# Altium integrated library RL2.IntLib: 663 symbols (part 4 of 4)
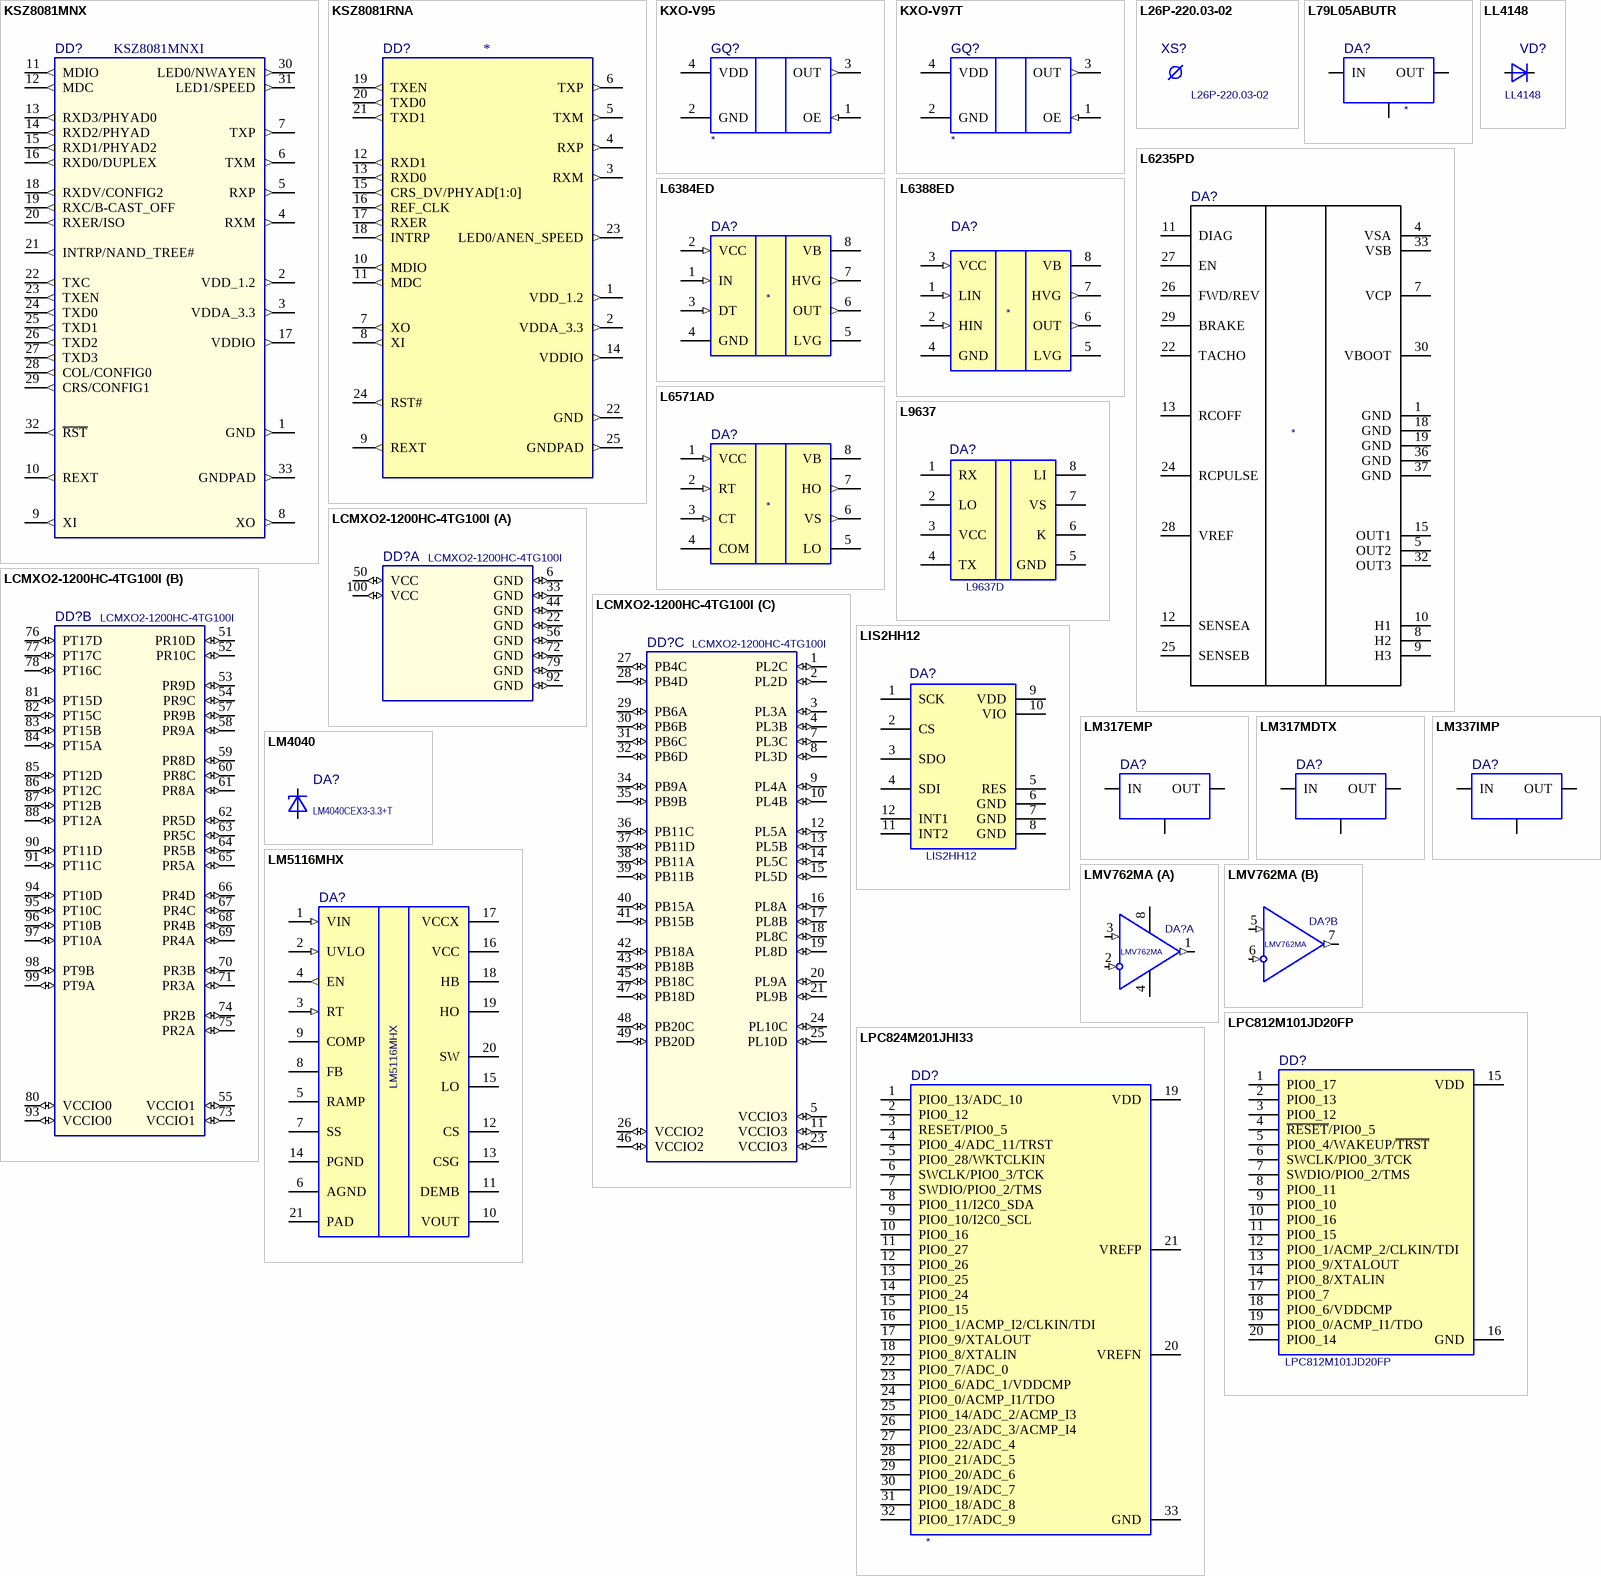
[diagram p37: symbols KSZ8081MNX to LPC824M201JHI33]

## L9637
designator DA?, comment L9637D
Monolithic bus driver with ISO 9141 interface; Part Field 1: *; Part Field 2: *
footprint SOIC8 JEDEC
pins: 1 RX, 2 LO, 3 VCC, 4 TX, 5 GND, 6 K, 7 VS, 8 LI

## LCMXO2-1200HC-4TG100I
designator DD?
footprint LQFP100_MS-026
part A pins: 6 GND (io), 22 GND (io), 33 GND (io), 44 GND (io), 50 VCC (io), 56 GND (io), 72 GND (io), 79 GND (io), 92 GND (io), 100 VCC (io)
part B pins: 51 PR10D (io), 52 PR10C (io), 53 PR9D (io), 54 PR9C (io), 55 VCCIO1 (io), 57 PR9B (io), 58 PR9A (io), 59 PR8D (io), 60 PR8C (io), 61 PR8A (io), 62 PR5D (io), 63 PR5C (io), 64 PR5B (io), 65 PR5A (io), 66 PR4D (io), 67 PR4C (io), 68 PR4B (io), 69 PR4A (io), 70 PR3B (io), 71 PR3A (io), 73 VCCIO1 (io), 74 PR2B (io), 75 PR2A (io), 76 PT17D (io), 77 PT17C (io), 78 PT16C (io), 80 VCCIO0 (io), 81 PT15D (io), 82 PT15C (io), 83 PT15B (io), 84 PT15A (io), 85 PT12D (io), 86 PT12C (io), 87 PT12B (io), 88 PT12A (io), 90 PT11D (io), 91 PT11C (io), 93 VCCIO0 (io), 94 PT10D (io), 95 PT10C (io), 96 PT10B (io), 97 PT10A (io), 98 PT9B (io), 99 PT9A (io)
part C pins: 1 PL2C (io), 2 PL2D (io), 3 PL3A (io), 4 PL3B (io), 5 VCCIO3 (io), 7 PL3C (io), 8 PL3D (io), 9 PL4A (io), 10 PL4B (io), 11 VCCIO3 (io), 12 PL5A (io), 13 PL5B (io), 14 PL5C (io), 15 PL5D (io), 16 PL8A (io), 17 PL8B (io), 18 PL8C (io), 19 PL8D (io), 20 PL9A (io), 21 PL9B (io), 23 VCCIO3 (io), 24 PL10C (io), 25 PL10D (io), 26 VCCIO2 (io), 27 PB4C (io), 28 PB4D (io), 29 PB6A (io), 30 PB6B (io), 31 PB6C (io), 32 PB6D (io), 34 PB9A (io), 35 PB9B (io), 36 PB11C (io), 37 PB11D (io), 38 PB11A (io), 39 PB11B (io), 40 PB15A (io), 41 PB15B (io), 42 PB18A (io), 43 PB18B (io), 45 PB18C (io), 46 VCCIO2 (io), 47 PB18D (io), 48 PB20C (io), 49 PB20D (io)

## LIS2HH12
designator DA?
ultra-low-power high-performance 3-axis "pico" accelerometer; Part Field 1: *; Part Field 2: *
footprint LGA-12
pins: 1 SCK, 2 CS, 3 SDO, 4 SDI, 5 RES, 6 GND, 7 GND, 8 GND, 9 VDD, 10 VIO, 11 INT2, 12 INT1

## LL4148
designator VD?
Value: *
footprint SOD-80 (DO-213AC)
pins: 1, 2

## LM317EMP
designator DA?, comment LM317EMP/NOPB  (value not drawn)
LM317EMP; Value: *
footprint SOT-223 PWR
pins: 1 G, 2 OUT, 3 IN

## LM317MDTX
designator DA?  (value not drawn)
LM317MDTX; Value: *
footprint D-PAK (TO-252)
pins: 1 G, 2 IN, 3 OUT

## LM337IMP
designator DA?, comment LM337IMP/NOPB  (value not drawn)
Value: *
footprint SOT-223 PWR
pins: 1 G, 2 IN, 3 OUT

## LM4040
designator DA?, comment LM4040CEX3-3.3+T
Improved Precision Micropower Shunt Voltage Reference
footprint SOT-23
pins: 1, 2

## LM5116MHX
designator DA?
6-100V Wide Vin, Current Mode Synchronous Buck Controller
footprint HTSSOP20 (MXA20A)
pins: 1 VIN (in), 2 UVLO (in), 3 RT (in), 4 EN (out), 5 RAMP (power), 6 AGND (power), 7 SS (power), 8 FB (power), 9 COMP (power), 10 VOUT (power), 11 DEMB (power), 12 CS (power), 13 CSG (power), 14 PGND (power), 15 LO (power), 16 VCC (power), 17 VCCX (power), 18 HB (power), 19 HO (power), 20 SW (power), 21 PAD (power)

## LMV762MA
designator DA?
footprint SOIC8 JEDEC
part A pins: 1 OUT (out), 2 - (in), 3 + (in), 4 V- (power), 8 V+ (power)
part B pins: 5 + (in), 6 - (in), 7 OUT (out)

## LPC812M101JD20FP
designator DD?
footprint SO20
footprint TSSOP20 (JEDEC MO-153)
footprint SO20 (JEDEC MS-013)
pins: 1 PIO0_17, 2 PIO0_13, 3 PIO0_12, 4 ~{RESET}/PIO0_5, 5 PIO0_4/WAKEUP/~{TRST}, 6 SWCLK/PIO0_3/TCK, 7 SWDIO/PIO0_2/TMS, 8 PIO0_11, 9 PIO0_10, 10 PIO0_16, 11 PIO0_15, 12 PIO0_1/ACMP_2/CLKIN/TDI, 13 PIO0_9/XTALOUT, 14 PIO0_8/XTALIN, 15 VDD, 16 GND, 17 PIO0_7, 18 PIO0_6/VDDCMP, 19 PIO0_0/ACMP_I1/TDO, 20 PIO0_14

## LPC824M201JHI33
designator DD?
footprint HVQFN33
pins: 1 PIO0_13/ADC_10, 2 PIO0_12, 3 RESET/PIO0_5, 4 PIO0_4/ADC_11/TRST, 5 PIO0_28/WKTCLKIN, 6 SWCLK/PIO0_3/TCK , 7 SWDIO/PIO0_2/TMS, 8 PIO0_11/I2C0_SDA, 9 PIO0_10/I2C0_SCL, 10 PIO0_16, 11 PIO0_27, 12 PIO0_26, 13 PIO0_25, 14 PIO0_24, 15 PIO0_15, 16 PIO0_1/ACMP_I2/CLKIN/TDI, 17 PIO0_9/XTALOUT, 18 PIO0_8/XTALIN, 19 VDD, 20 VREFN, 21 VREFP, 22 PIO0_7/ADC_0, 23 PIO0_6/ADC_1/VDDCMP, 24 PIO0_0/ACMP_I1/TDO, 25 PIO0_14/ADC_2/ACMP_I3, 26 PIO0_23/ADC_3/ACMP_I4, 27 PIO0_22/ADC_4, 28 PIO0_21/ADC_5, 29 PIO0_20/ADC_6, 30 PIO0_19/ADC_7, 31 PIO0_18/ADC_8, 32 PIO0_17/ADC_9, 33 GND

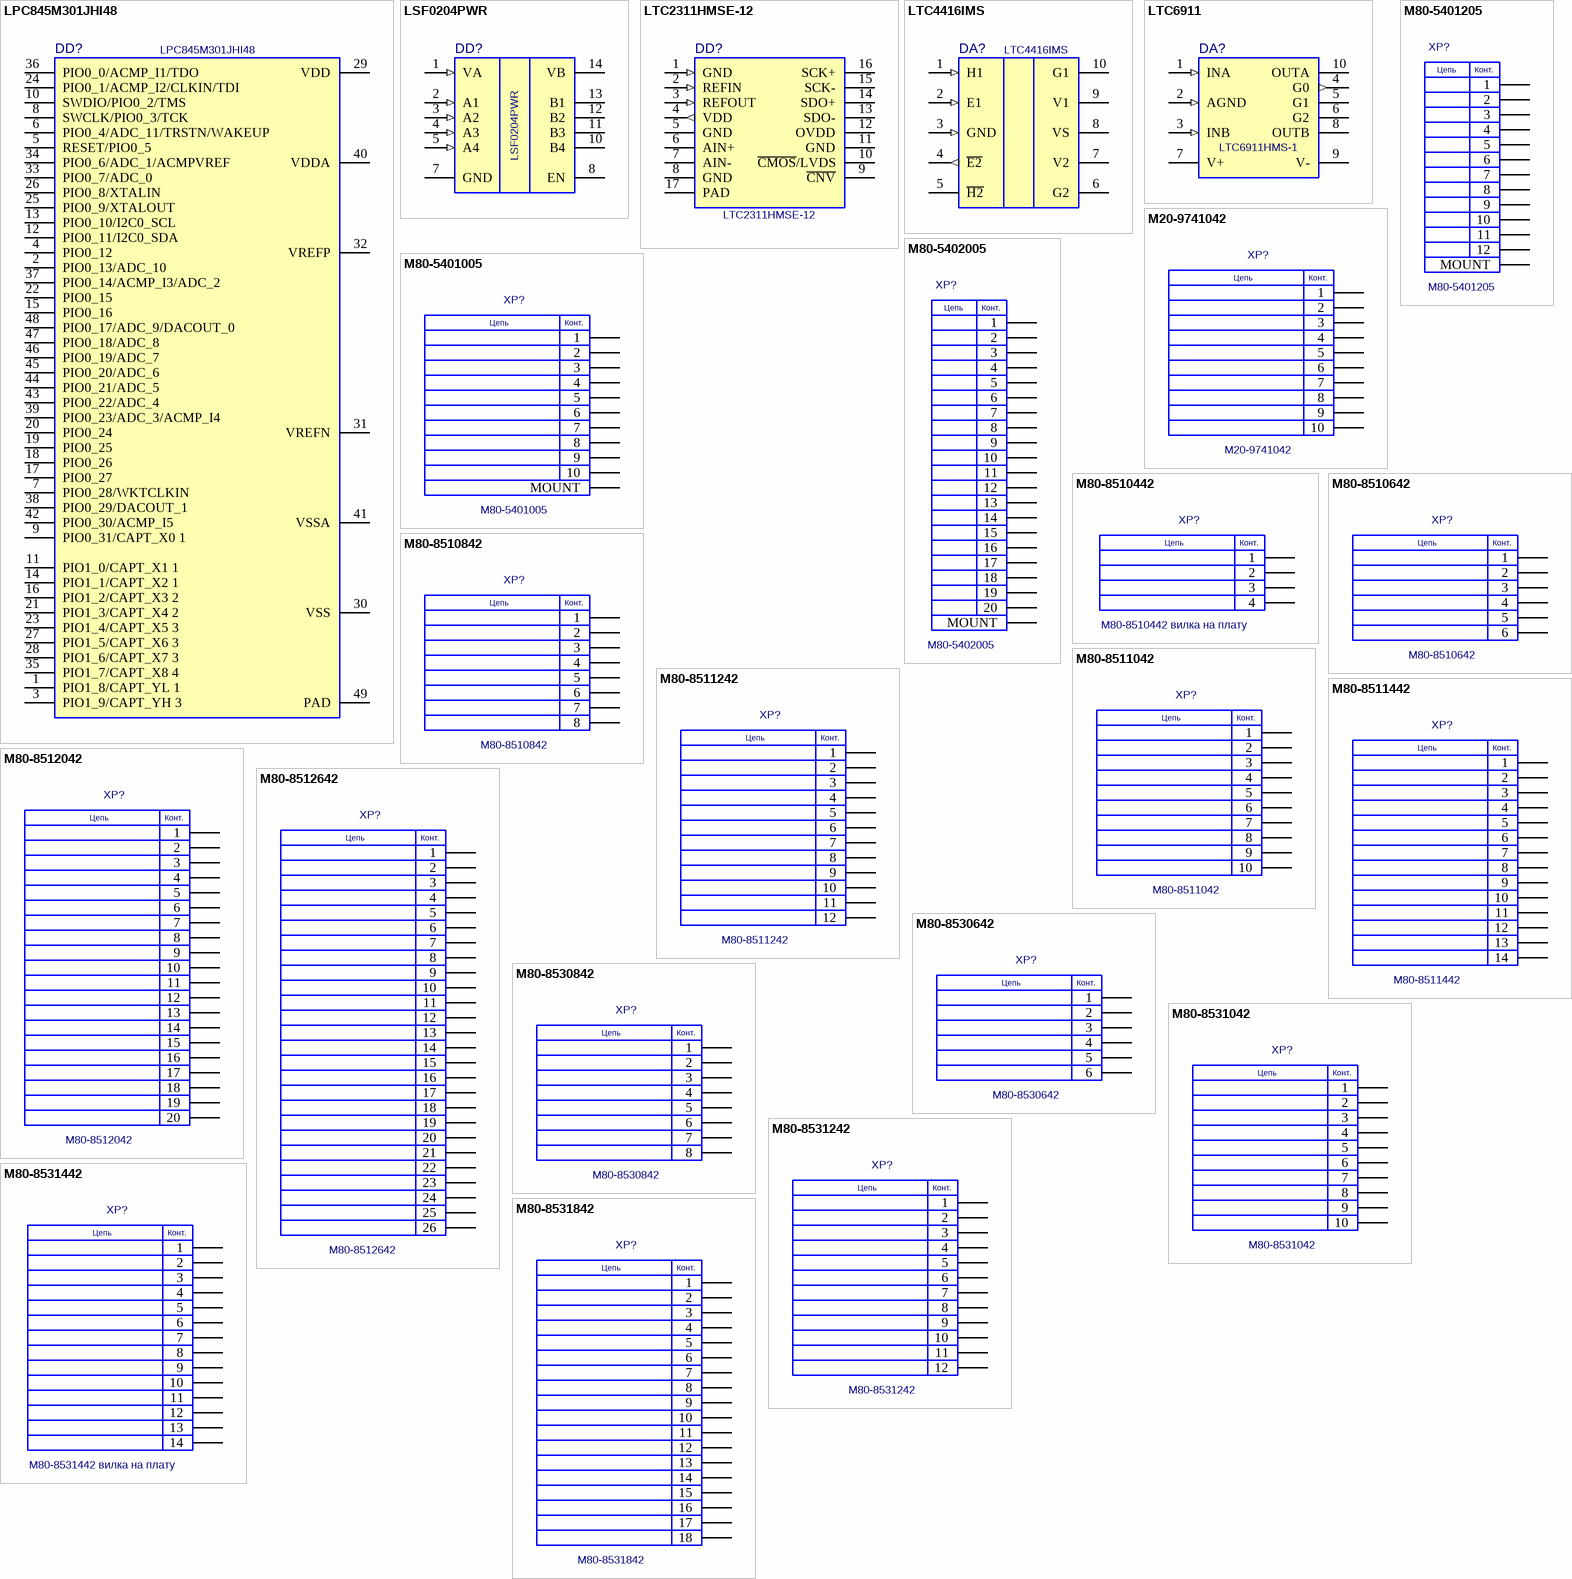
[diagram p29: symbols LPC845M301JHI48 to M80-8531842]

## LPC845M301JHI48
designator DD?
footprint HVQFN48 (SOT619-1, plastic thermal enhanced very thin quad flat package; no leads;  48 terminals; body 7 x 7 x 0.85 mm)
pins: 1 PIO1_8/CAPT_YL 1, 2 PIO0_13/ADC_10, 3 PIO1_9/CAPT_YH 3, 4 PIO0_12, 5 RESET/PIO0_5, 6 PIO0_4/ADC_11/TRSTN/WAKEUP, 7 PIO0_28/WKTCLKIN, 8 SWCLK/PIO0_3/TCK, 9 PIO0_31/CAPT_X0 1, 10 SWDIO/PIO0_2/TMS, 11 PIO1_0/CAPT_X1 1, 12 PIO0_11/I2C0_SDA, 13 PIO0_10/I2C0_SCL, 14 PIO1_1/CAPT_X2 1, 15 PIO0_16, 16 PIO1_2/CAPT_X3 2, 17 PIO0_27, 18 PIO0_26, 19 PIO0_25, 20 PIO0_24, 21 PIO1_3/CAPT_X4 2, 22 PIO0_15, 23 PIO1_4/CAPT_X5 3, 24 PIO0_1/ACMP_I2/CLKIN/TDI, 25 PIO0_9/XTALOUT, 26 PIO0_8/XTALIN, 27 PIO1_5/CAPT_X6 3, 28 PIO1_6/CAPT_X7 3, 29 VDD, 30 VSS, 31 VREFN, 32 VREFP, 33 PIO0_7/ADC_0, 34 PIO0_6/ADC_1/ACMPVREF, 35 PIO1_7/CAPT_X8 4, 36 PIO0_0/ACMP_I1/TDO, 37 PIO0_14/ACMP_I3/ADC_2, 38 PIO0_29/DACOUT_1, 39 PIO0_23/ADC_3/ACMP_I4, 40 VDDA, 41 VSSA, 42 PIO0_30/ACMP_I5, 43 PIO0_22/ADC_4, 44 PIO0_21/ADC_5, 45 PIO0_20/ADC_6, 46 PIO0_19/ADC_7, 47 PIO0_18/ADC_8, 48 PIO0_17/ADC_9/DACOUT_0, 49 PAD

## LSF0204PWR
designator DD?
footprint TSSOP14 (JEDEC MO-153)
pins: 1 VA (in), 2 A1 (in), 3 A2 (in), 4 A3 (in), 5 A4 (in), 7 GND (power), 8 EN (power), 10 B4 (power), 11 B3 (power), 12 B2 (power), 13 B1 (power), 14 VB (power)

## LTC2311HMSE-12
designator DD?
12-Bit + Sign, 5Msps / Differential Input ADC with Wide / Input Common Mode Range
footprint MSOP16 POWERPAD (MSE Package (Reference LTC DWG # 05-08-1667 Rev F))
pins: 1 GND (in), 2 REFIN (in), 3 REFOUT (in), 4 VDD (out), 5 GND (power), 6 AIN+ (power), 7 AIN- (power), 8 GND (power), 9 ~{CNV} (power), 10 ~{CMOS}/LVDS (power), 11 GND (power), 12 OVDD (power), 13 SDO- (power), 14 SDO+ (power), 15 SCK- (power), 16 SCK+ (power), 17 PAD (power)

## LTC4416IMS
designator DA?
36V, Low Loss Dual PowerPath Controllers for Large PFETs
footprint MSOP10 (MO-187-BA)
pins: 1 H1 (in), 2 E1 (in), 3 GND (in), 4 ~{E2} (out), 5 ~{H2} (power), 6 G2 (power), 7 V2 (power), 8 VS (power), 9 V1 (power), 10 G1 (power)

## LTC6911
designator DA?, comment LTC6911HMS-1
Dual Matched Amplifiers with Digitally Programmable Gain in MSOP
footprint MSOP10 (MO-187-BA)
pins: 1 INA (in), 2 AGND (in), 3 INB (in), 4 G0 (out), 5 G1 (power), 6 G2 (power), 7 V+ (power), 8 OUTB (power), 9 V- (power), 10 OUTA (power)

## M20-9741042
designator XP?
Value: *
footprint M20-9741042
pins: 1, 2, 3, 4, 5, 6, 7, 8, 9, 10
text: Цепь; Конт.

## M80-5401005
designator XP?
M80-8531242; Value: *
footprint M80-5401005
pins: 0 MOUNT, 1, 2, 3, 4, 5, 6, 7, 8, 9, 10
text: Цепь; Конт.

## M80-5401205
designator XP?
Value: *
footprint M80-5401205
pins: 0 MOUNT, 1, 2, 3, 4, 5, 6, 7, 8, 9, 10, 11, 12
text: Цепь; Конт.

## M80-5402005
designator XP?
M80-5401205; Value: *
footprint M80-5402005
pins: 0 MOUNT, 1, 2, 3, 4, 5, 6, 7, 8, 9, 10, 11, 12, 13, 14, 15, 16, 17, 18, 19, 20
text: Цепь; Конт.

## M80-8510442
designator XP?, comment M80-8510442 вилка на плату
M80-8510642; Value: *
footprint M80-85104
pins: 1, 2, 3, 4
text: Цепь; Конт.

## M80-8510642
designator XP?
Value: *
footprint M80-85106
pins: 1, 2, 3, 4, 5, 6
text: Цепь; Конт.

## M80-8510842
designator XP?
Value: *
footprint M80-85108
pins: 1, 2, 3, 4, 5, 6, 7, 8
text: Цепь; Конт.

## M80-8511042
designator XP?
Value: *
footprint M80-85110
pins: 1, 2, 3, 4, 5, 6, 7, 8, 9, 10
text: Цепь; Конт.

## M80-8511242
designator XP?
Value: *
footprint M80-85112
pins: 1, 2, 3, 4, 5, 6, 7, 8, 9, 10, 11, 12
text: Цепь; Конт.

## M80-8511442
designator XP?
Value: *
footprint M80-85114
pins: 1, 2, 3, 4, 5, 6, 7, 8, 9, 10, 11, 12, 13, 14
text: Цепь; Конт.

## M80-8512042
designator XP?
Value: *
footprint M80-85120
pins: 1, 2, 3, 4, 5, 6, 7, 8, 9, 10, 11, 12, 13, 14, 15, 16, 17, 18, 19, 20
text: Цепь; Конт.

## M80-8512642
designator XP?
M80-8532042; Value: *
footprint M80-85126
pins: 1, 2, 3, 4, 5, 6, 7, 8, 9, 10, 11, 12, 13, 14, 15, 16, 17, 18, 19, 20, 21, 22, 23, 24, 25, 26
text: Цепь; Конт.

## M80-8530642
designator XP?
Value: *
footprint M80-85306
pins: 1, 2, 3, 4, 5, 6
text: Цепь; Конт.

## M80-8530842
designator XP?
Value: *
footprint M80-85308
pins: 1, 2, 3, 4, 5, 6, 7, 8
text: Цепь; Конт.

## M80-8531042
designator XP?
Value: *
footprint M80-85310
pins: 1, 2, 3, 4, 5, 6, 7, 8, 9, 10
text: Цепь; Конт.

## M80-8531242
designator XP?
Value: *
footprint M80-85312
pins: 1, 2, 3, 4, 5, 6, 7, 8, 9, 10, 11, 12
text: Цепь; Конт.

## M80-8531442
designator XP?, comment M80-8531442 вилка на плату
M80-8531442; Value: *
footprint M80-85314
pins: 1, 2, 3, 4, 5, 6, 7, 8, 9, 10, 11, 12, 13, 14
text: Цепь; Конт.

## M80-8531842
designator XP?
Value: *
footprint M80-85318
pins: 1, 2, 3, 4, 5, 6, 7, 8, 9, 10, 11, 12, 13, 14, 15, 16, 17, 18
text: Цепь; Конт.

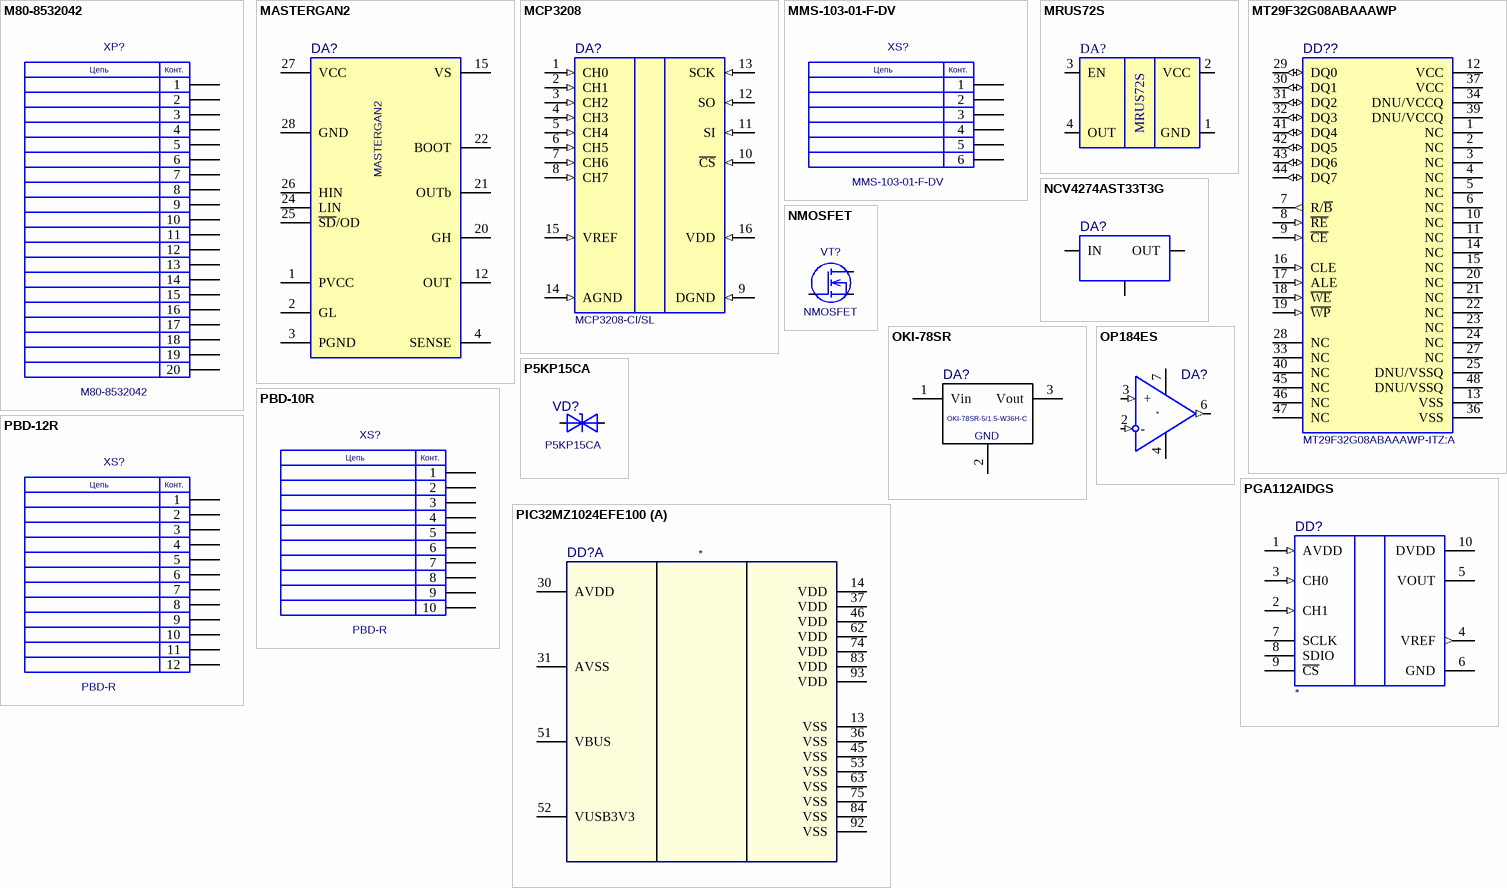
[diagram p30: symbols M80-8532042 to PIC32MZ1024EFE100]

## M80-8532042
designator XP?
Value: *
footprint M80-85320
pins: 1, 2, 3, 4, 5, 6, 7, 8, 9, 10, 11, 12, 13, 14, 15, 16, 17, 18, 19, 20
text: Цепь; Конт.

## MASTERGAN2
designator DA?
High power density 600V Half bridge driver with two enhancement mode GaN HEMT / RDS(ON) = 150 mΩ (LS) + 225 mΩ (HS) / IDS(MAX) = 10 A (LS) + 6.5 A (HS); Part Field 1: *; Part Field 2: *
footprint MASTERGAN2 (QFN 9 x 9 x 1 mm)
pins: 1 PVCC, 2 GL, 3 PGND, 4 SENSE, 12 OUT, 15 VS, 20 GH, 21 OUTb, 22 BOOT, 24 LIN, 25 ~{SD}/OD, 26 HIN, 27 VCC, 28 GND

## MCP3208
designator DA?, comment MCP3208-CI/SL
8-Channel 12-Bit A/D Converter with SPI™   Serial Interface
footprint SOIC16
signal-integrity model Model Name (Model Description)
pins: 1 CH0 (in), 2 CH1 (in), 3 CH2 (in), 4 CH3 (in), 5 CH4 (in), 6 CH5 (in), 7 CH6 (in), 8 CH7 (in), 9 DGND (in), 10 ~{CS} (in), 11 SI (in), 12 SO (in), 13 SCK (in), 14 AGND (in), 15 VREF (in), 16 VDD (in)

## MMS-103-01-F-DV
designator XS?
Value: *
footprint MMS-103-01-F-DV
pins: 1, 2, 3, 4, 5, 6
text: Цепь; Конт.

## MRUS72S
designator DA?
Hall sensor
footprint MINI FLP-4
pins: 1 GND, 2 VCC, 3 EN, 4 OUT

## MT29F32G08ABAAAWP
designator DD??, comment MT29F32G08ABAAAWP-ITZ:A
Part Field 1: *; Part Field 2: *
footprint TSSO12X20-G48/P.5
pins: 1 NC, 2 NC, 3 NC, 4 NC, 5 NC, 6 NC, 7 R/~{B} (out), 8 ~{RE} (in), 9 ~{CE} (in), 10 NC, 11 NC, 12 VCC (power), 13 VSS (power), 14 NC (power), 15 NC (power), 16 CLE (in), 17 ALE (in), 18 ~{WE} (in), 19 ~{WP} (in), 20 NC, 21 NC, 22 NC, 23 NC, 24 NC, 25 DNU/VSSQ, 27 NC, 28 NC, 29 DQ0 (io), 30 DQ1 (io), 31 DQ2 (io), 32 DQ3 (io), 33 NC, 34 DNU/VCCQ, 36 VSS (power), 37 VCC (power), 39 DNU/VCCQ, 40 NC, 41 DQ4 (io), 42 DQ5 (io), 43 DQ6 (io), 44 DQ7 (io), 45 NC, 46 NC, 47 NC, 48 DNU/VSSQ

## NCV4274AST33T3G
designator DA?  (value not drawn)
NCV4274AST33T3G; Value: *
footprint SOT-223 PWR
pins: 1 IN, 2 G, 3 OUT

## NMOSFET
designator VT?
N-channel MOSFET; OriginalName: 2N4124; ComponentField6: Published 8-Jun-2000, Modified 11-July-2000: SIM Model Added.; Value: *
footprint D-PAK (TO-252)
footprint D2PAK TO-263-2
footprint D3PAK TO-268-2L
pins: 1 G, 2 S, 3 D

## OKI-78SR
designator DA?, comment OKI-78SR-5/1.5-W36H-C
Fixed Output 1.5 Amp SIP DC/DC Converter
footprint OKI-78SR-H
pins: 1 Vin, 2, 3 Vout
text: GND

## OP184ES
designator DA?
footprint SOIC8 JEDEC
pins: 2 - (in), 3 + (in), 4 V- (power), 6 OUT (out), 7 V+ (power)

## P5KP15CA
designator VD?
footprint P600
pins: 1, 2

## PBD-10R
designator XS?, comment PBD-R
Value: *; Part Field 2: 10 конт.
footprint PBD-10R
pins: 1, 2, 3, 4, 5, 6, 7, 8, 9, 10
text: Цепь; Конт.

## PBD-12R
designator XS?, comment PBD-R
Value: *; Part Field 2: 12 конт.
footprint PBD-12R
pins: 1, 2, 3, 4, 5, 6, 7, 8, 9, 10, 11, 12
text: Цепь; Конт.

## PGA112AIDGS
designator DD?
footprint MSOP10 (MO-187-BA)
pins: 1 AVDD (in), 2 CH1 (in), 3 CH0 (in), 4 VREF (out), 5 VOUT (power), 6 GND (power), 7 SCLK (power), 8 SDIO (power), 9 ~{CS} (power), 10 DVDD (power)

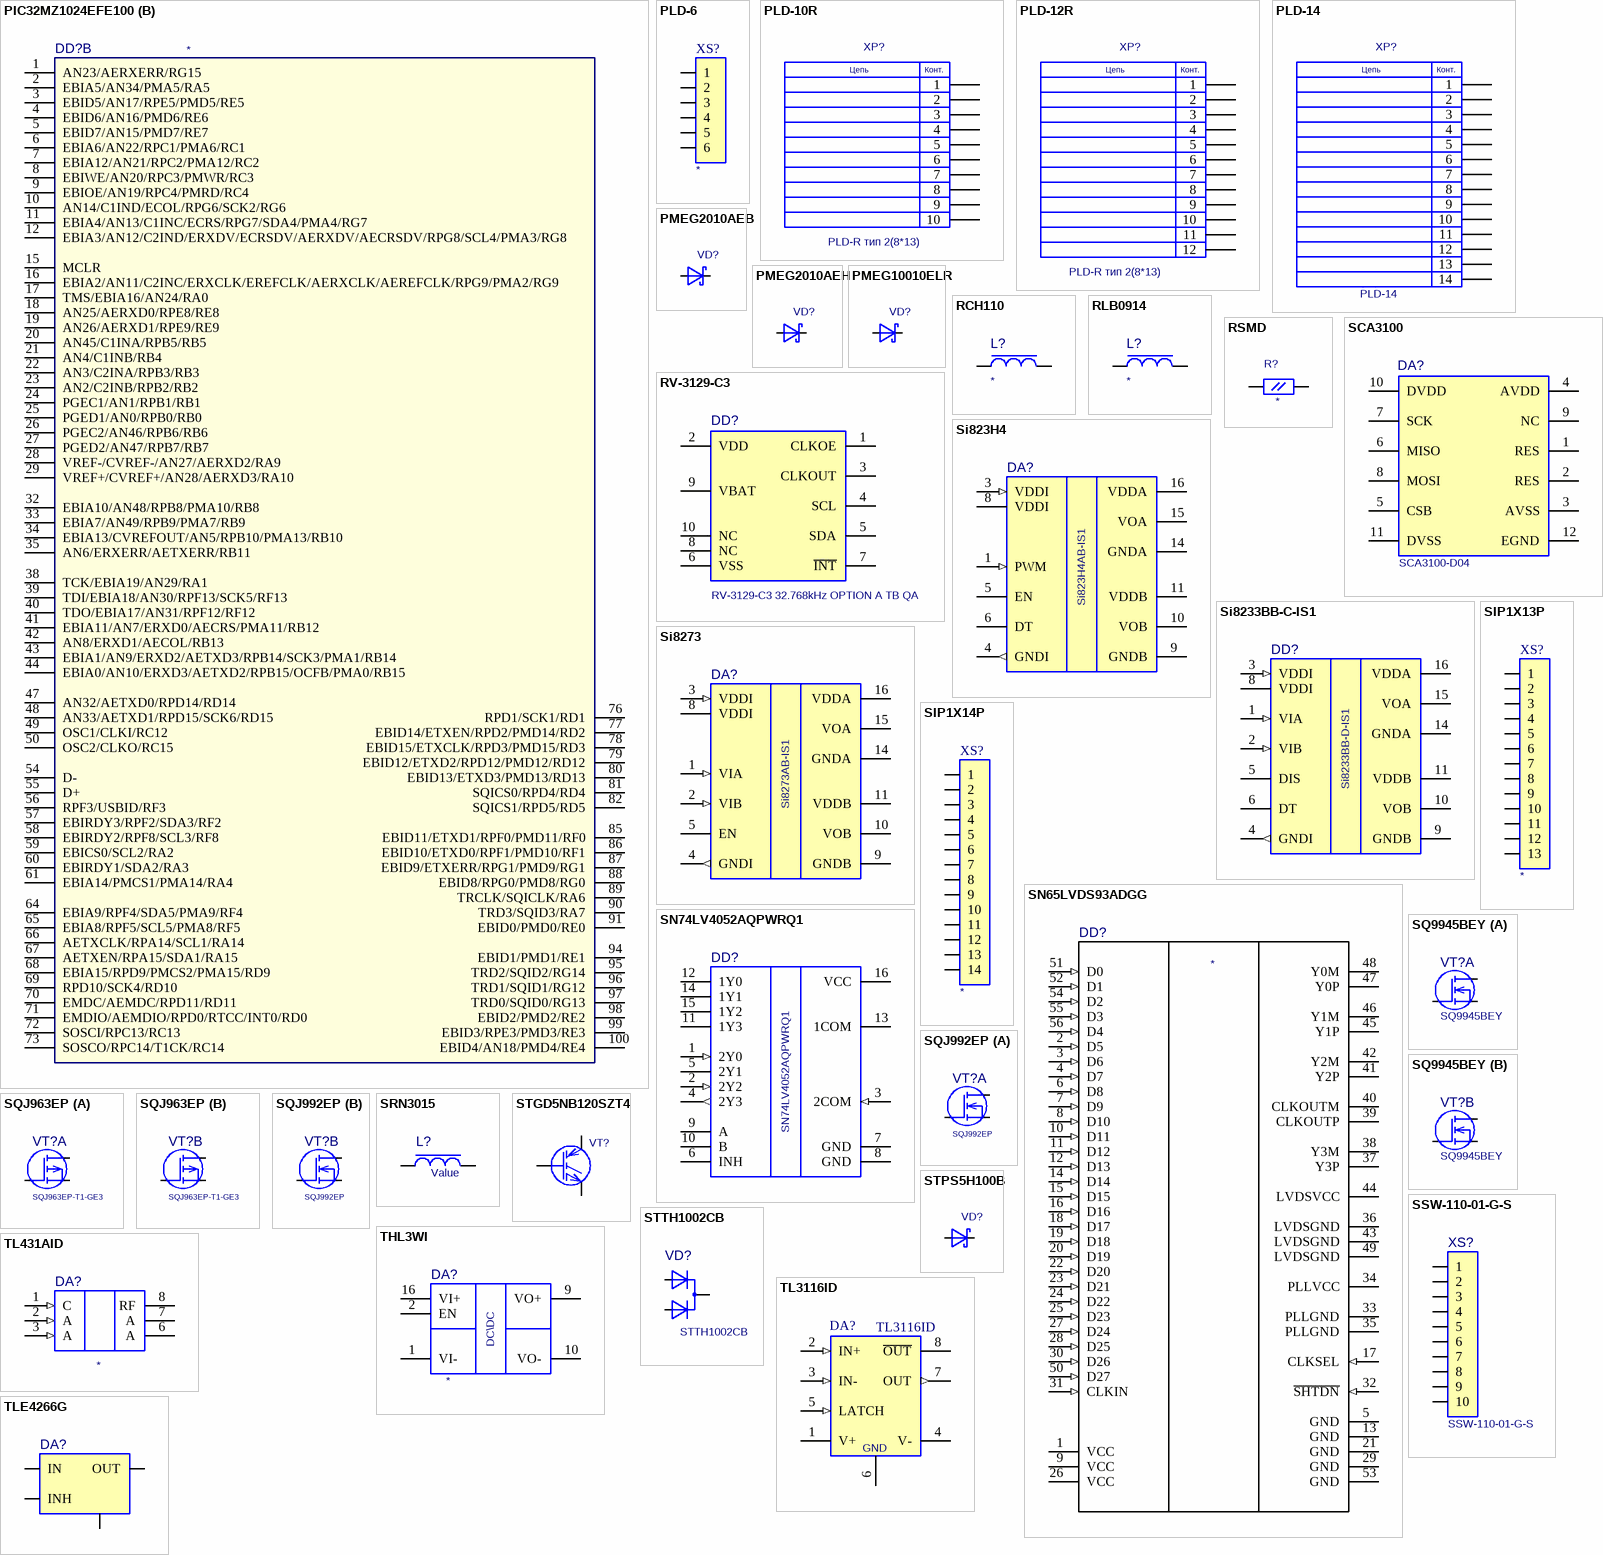
[diagram p31: symbols PIC32MZ1024EFE100 to TLE4266G]

## PIC32MZ1024EFE100
designator DD?
footprint LQFP100_MS-026
part A pins: 13 VSS (power), 14 VDD (power), 30 AVDD (power), 31 AVSS (power), 36 VSS (power), 37 VDD (power), 45 VSS (power), 46 VDD (power), 51 VBUS (power), 52 VUSB3V3 (power), 53 VSS (power), 62 VDD (power), 63 VSS (power), 74 VDD (power), 75 VSS (power), 83 VDD (power), 84 VSS (power), 92 VSS (power), 93 VDD (power)
part B pins: 1 AN23/AERXERR/RG15 (power), 2 EBIA5/AN34/PMA5/RA5 (power), 3 EBID5/AN17/RPE5/PMD5/RE5 (power), 4 EBID6/AN16/PMD6/RE6 (power), 5 EBID7/AN15/PMD7/RE7 (power), 6 EBIA6/AN22/RPC1/PMA6/RC1 (power), 7 EBIA12/AN21/RPC2/PMA12/RC2 (power), 8 EBIWE/AN20/RPC3/PMWR/RC3 (power), 9 EBIOE/AN19/RPC4/PMRD/RC4 (power), 10 AN14/C1IND/ECOL/RPG6/SCK2/RG6 (power), 11 EBIA4/AN13/C1INC/ECRS/RPG7/SDA4/PMA4/RG7 (power), 12 EBIA3/AN12/C2IND/ERXDV/ECRSDV/AERXDV/AECRSDV/RPG8/SCL4/PMA3/RG8 (power), 15 MCLR (power), 16 EBIA2/AN11/C2INC/ERXCLK/EREFCLK/AERXCLK/AEREFCLK/RPG9/PMA2/RG9 (power), 17 TMS/EBIA16/AN24/RA0 (power), 18 AN25/AERXD0/RPE8/RE8 (power), 19 AN26/AERXD1/RPE9/RE9 (power), 20 AN45/C1INA/RPB5/RB5 (power), 21 AN4/C1INB/RB4 (power), 22 AN3/C2INA/RPB3/RB3 (power), 23 AN2/C2INB/RPB2/RB2 (power), 24 PGEC1/AN1/RPB1/RB1 (power), 25 PGED1/AN0/RPB0/RB0 (power), 26 PGEC2/AN46/RPB6/RB6 (power), 27 PGED2/AN47/RPB7/RB7 (power), 28 VREF-/CVREF-/AN27/AERXD2/RA9 (power), 29 VREF+/CVREF+/AN28/AERXD3/RA10 (power), 32 EBIA10/AN48/RPB8/PMA10/RB8 (power), 33 EBIA7/AN49/RPB9/PMA7/RB9 (power), 34 EBIA13/CVREFOUT/AN5/RPB10/PMA13/RB10 (power), 35 AN6/ERXERR/AETXERR/RB11 (power), 38 TCK/EBIA19/AN29/RA1 (power), 39 TDI/EBIA18/AN30/RPF13/SCK5/RF13 (power), 40 TDO/EBIA17/AN31/RPF12/RF12 (power), 41 EBIA11/AN7/ERXD0/AECRS/PMA11/RB12 (power), 42 AN8/ERXD1/AECOL/RB13 (power), 43 EBIA1/AN9/ERXD2/AETXD3/RPB14/SCK3/PMA1/RB14 (power), 44 EBIA0/AN10/ERXD3/AETXD2/RPB15/OCFB/PMA0/RB15 (power), 47 AN32/AETXD0/RPD14/RD14 (power), 48 AN33/AETXD1/RPD15/SCK6/RD15 (power), 49 OSC1/CLKI/RC12 (power), 50 OSC2/CLKO/RC15 (power), 54 D- (power), 55 D+ (power), 56 RPF3/USBID/RF3 (power), 57 EBIRDY3/RPF2/SDA3/RF2 (power), 58 EBIRDY2/RPF8/SCL3/RF8 (power), 59 EBICS0/SCL2/RA2 (power), 60 EBIRDY1/SDA2/RA3 (power), 61 EBIA14/PMCS1/PMA14/RA4 (power), 64 EBIA9/RPF4/SDA5/PMA9/RF4 (power), 65 EBIA8/RPF5/SCL5/PMA8/RF5 (power), 66 AETXCLK/RPA14/SCL1/RA14 (power), 67 AETXEN/RPA15/SDA1/RA15 (power), 68 EBIA15/RPD9/PMCS2/PMA15/RD9 (power), 69 RPD10/SCK4/RD10 (power), 70 EMDC/AEMDC/RPD11/RD11 (power), 71 EMDIO/AEMDIO/RPD0/RTCC/INT0/RD0 (power), 72 SOSCI/RPC13/RC13 (power), 73 SOSCO/RPC14/T1CK/RC14 (power), 76 RPD1/SCK1/RD1 (power), 77 EBID14/ETXEN/RPD2/PMD14/RD2 (power), 78 EBID15/ETXCLK/RPD3/PMD15/RD3 (power), 79 EBID12/ETXD2/RPD12/PMD12/RD12 (power), 80 EBID13/ETXD3/PMD13/RD13 (power), 81 SQICS0/RPD4/RD4 (power), 82 SQICS1/RPD5/RD5 (power), 85 EBID11/ETXD1/RPF0/PMD11/RF0 (power), 86 EBID10/ETXD0/RPF1/PMD10/RF1 (power), 87 EBID9/ETXERR/RPG1/PMD9/RG1 (power), 88 EBID8/RPG0/PMD8/RG0 (power), 89 TRCLK/SQICLK/RA6 (power), 90 TRD3/SQID3/RA7 (power), 91 EBID0/PMD0/RE0 (power), 94 EBID1/PMD1/RE1 (power), 95 TRD2/SQID2/RG14 (power), 96 TRD1/SQID1/RG12 (power), 97 TRD0/SQID0/RG13 (power), 98 EBID2/PMD2/RE2 (power), 99 EBID3/RPE3/PMD3/RE3 (power), 100 EBID4/AN18/PMD4/RE4 (power)